# Altium footprint library TO.PcbLib: 24 footprints (part 2 of 2)
Each footprint in its own frame and in the unit in brackets; x right, y up, seen from the top. Pads: shape width x height; smd on the part's side, far side on the other; paste and mask are expansions set on the pad; w line width, h text height; cw(c..) or ccw(c..) is an arc to the next point about the centre after c.
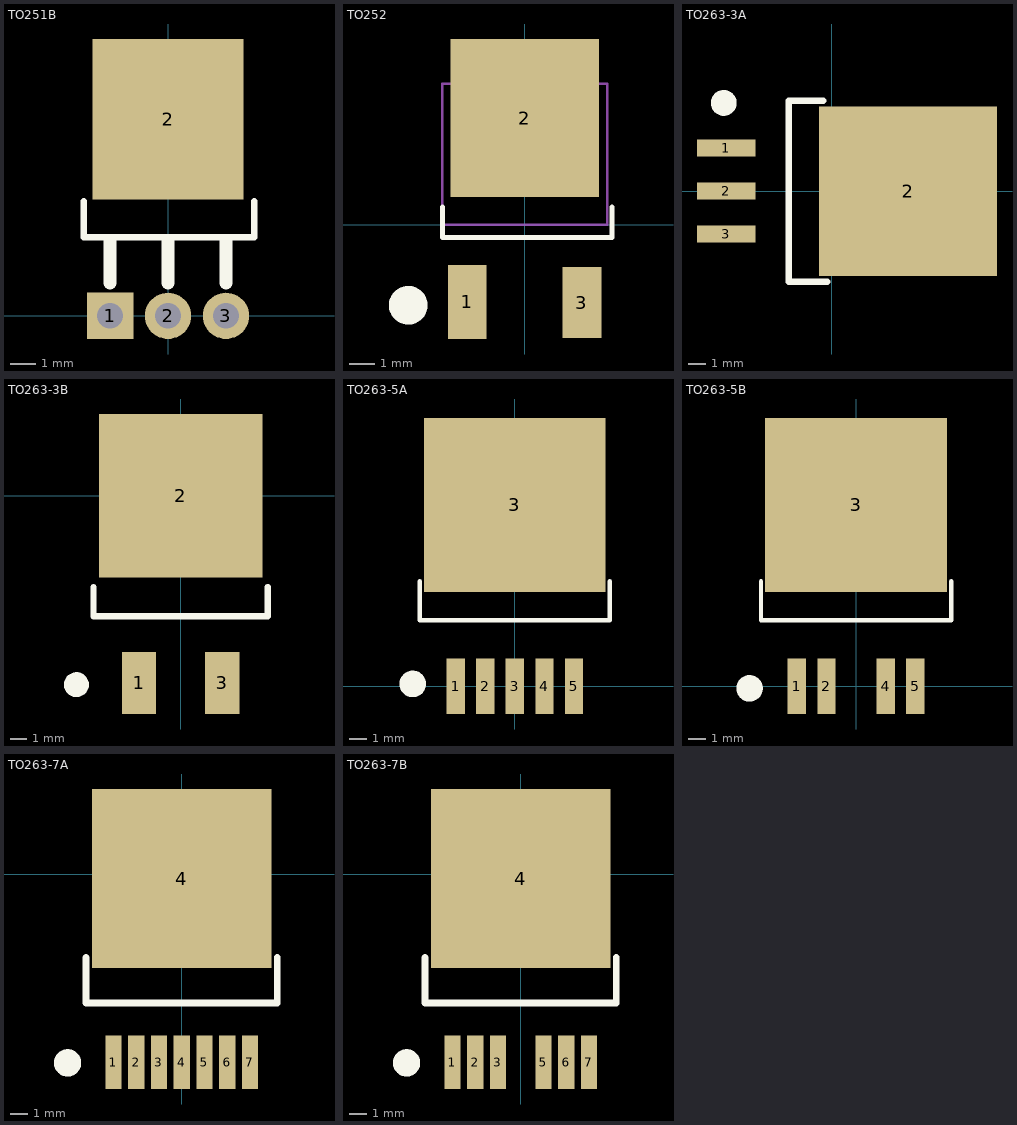
[diagram p1: the footprints below, top view; thin cyan lines are the x and y axes]

## TO251B [mm] "251£¬3½Å¾§Ìå¹Ü"
height 0.9
pads (4):
  rect 1.8x1.8 hole 1: 1(-2.248,0)
  round 1.8 hole 1: 2(0,0) 3(2.248,0)
  rect 5.842x6.223 smd: 2(0,7.62)
Top Overlay:
  lines w0.254: -3.264,4.445 -3.264,3.048 3.34,3.048 3.34,4.445
  lines w0.508: -2.248,1.27 -2.248,2.921 ; 0,1.27 0,2.921 ; 2.248,1.27 2.248,2.921
3D body "TO251B.STEP": height 2.3, standoff -3, extent -3.3,-0.25 3.3,9.912

## TO252 [mil] "252¾§Ìå¹Ü"
pads (3):
  rect 60x115 smd: 1(-89.55,-119.77)
  rect 230x245 smd: 2(0,165.35)
  rect 60x110 smd: 3(88.45,-120.77)
Top Overlay:
  circle w30: c-180.86,-125 r15
  lines w7.87: -127.95,27.56 -127.95,-20 135,-20 135,27.56
Mechanical 15:
  lines w3.94: -105.04,218.5 -105.04,236.06 -65.59,271.65 65.59,271.65 105.04,236.06 105.04,218.5 ; -127.95,0 127.95,0 127.95,218.5 -127.95,218.5 -127.95,0
3D body "TO252.STEP": height 90.55, standoff -0.2, extent -126.95,-120.28 128.95,250.56

## TO263-3A [mm] "263£¬3½Å¾§Ìå¹Ü"
height 4.5
pads (4):
  rect 3.45x1 smd: 1(-6.225,2.54) 2(-6.225,0) 3(-6.225,-2.54)
  rect 10.5x10 smd: 2(4.5,0)
Top Overlay:
  circle w0.762: c-6.372,5.207 r0.381
  lines w0.381: -0.508,5.334 -2.54,5.334 -2.54,-5.334 -0.254,-5.334
3D body "TO263-3.STEP": height 4.7, standoff -0.01, extent -6.235,-5 8.192,5

## TO263-3B [mm] "263£¬3½Å¾§Ìå¹Ü"
pads (3):
  rect 2.1x3.8 smd: 1(-2.54,-11.45) 3(2.54,-11.45)
  rect 10x10 smd: 2(0,0)
Top Overlay:
  circle w0.762: c-6.372,-11.557 r0.381
  lines w0.381: -5.334,-5.588 -5.334,-7.366 5.334,-7.366 5.334,-5.588
3D body "TO263.STEP": height 4.5, standoff -0.01, extent -5,-11.463 5,3.467

## TO263-5A [mm] "263£¬5½Å¾§Ìå¹Ü"
pads (6):
  rect 1.05x3.2 smd: 1(-3.4,0) 2(-1.7,0) 3(0,0) 4(1.7,0) 5(3.4,0)
  rect 10.45x10 smd: 3(0,10.414)
Top Overlay:
  circle w0.762: c-5.864,0.127 r0.381
  lines w0.254: -5.461,6.037 -5.461,3.787 5.461,3.787 5.461,6.037
3D body "TO263-5A.STEP": height 4.5, standoff 0, extent -5,-0.01 5,13.317

## TO263-5B [mm] "263£¬5½Å¾§Ìå¹Ü"
pads (5):
  rect 1.05x3.2 smd: 1(-3.4,0) 2(-1.7,0) 4(1.7,0) 5(3.4,0)
  rect 10.45x10 smd: 3(0,10.414)
Top Overlay:
  circle w0.762: c-6.118,-0.127 r0.381
  lines w0.254: -5.461,6.037 -5.461,3.787 5.461,3.787 5.461,6.037
3D body "TO263-5B.STEP": height 4.5, standoff -0.01, extent -5,-0.01 5,13.317

## TO263-7A [mm] "263£¬7½Å¾§Ìå¹Ü"
pads (8):
  rect 0.9x3 smd: 1(-3.81,-10.5) 2(-2.54,-10.5) 3(-1.27,-10.5) 4(0,-10.5) 5(1.27,-10.5) 6(2.54,-10.5) 7(3.81,-10.5)
  rect 10x10 smd: 4(0,-0.254)
Top Overlay:
  circle w0.762: c-6.372,-10.541 r0.381
  lines w0.381: -5.334,-4.658 -5.334,-7.198 5.334,-7.198 5.334,-4.658
3D body "TO263-7A.STEP": height 4.4, standoff -0.01, extent -5,-10.51 5,2.817

## TO263-7B [mm] "263£¬7½Å¾§Ìå¹Ü"
pads (7):
  rect 0.9x3 smd: 1(-3.81,-10.5) 2(-2.54,-10.5) 3(-1.27,-10.5) 5(1.27,-10.5) 6(2.54,-10.5) 7(3.81,-10.5)
  rect 10x10 smd: 4(0,-0.254)
Top Overlay:
  circle w0.762: c-6.372,-10.541 r0.381
  lines w0.381: -5.334,-4.658 -5.334,-7.198 5.334,-7.198 5.334,-4.658
3D body "TO263-7B.STEP": height 4.4, standoff -0.01, extent -5,-10.51 5,2.817